# Altium footprint library CONN_HDR_1.27MM_ST.PcbLib: 116 footprints (part 8 of 9)
Each footprint in its own frame and in the unit in brackets; x right, y up, seen from the top. Pads: shape width x height; smd on the part's side, far side on the other; paste and mask are expansions set on the pad; w line width, h text height; cw(c..) or ccw(c..) is an arc to the next point about the centre after c.
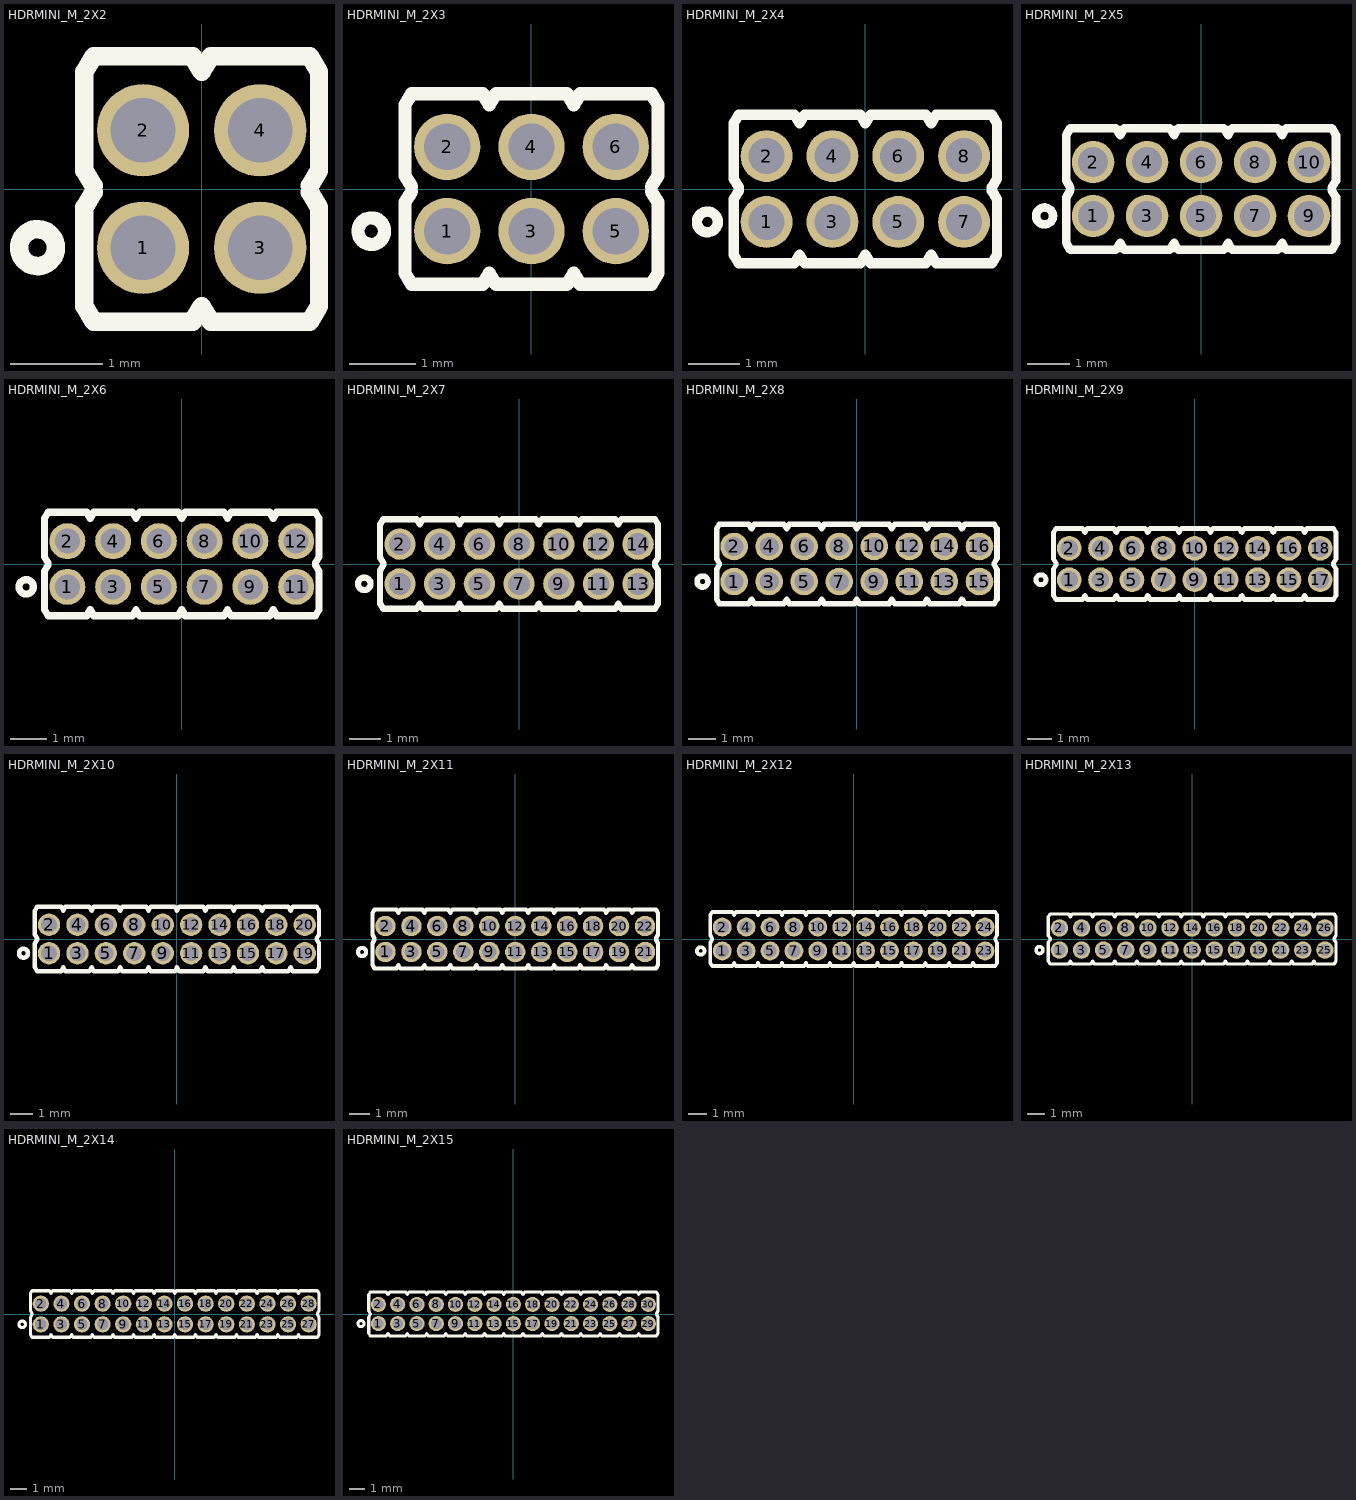
[diagram p7: the footprints below, top view; thin cyan lines are the x and y axes]

## HDRMINI_M_2X2 [mm] "mini header (50mil pitch)"
pads (4):
  round 1 hole 0.7 mask+0.05: 1(-0.635,-0.635) 2(-0.635,0.635) 3(0.635,-0.635) 4(0.635,0.635)
Top Overlay:
  circle w0.2: c-1.778,-0.635 r0.2
  lines w0.2: -1.171,-0.035 -1.27,-0.2 -1.27,-1.27 -1.171,-1.435 -0.099,-1.435 0,-1.27 0.099,-1.435 1.171,-1.435 1.27,-1.27 1.27,-0.2 1.171,-0.035 ; -1.171,0.035 -1.27,0.2 -1.27,1.27 -1.171,1.435 -0.099,1.435 0,1.27 0.099,1.435 1.171,1.435 1.27,1.27 1.27,0.2 1.171,0.035
3D body: height 2.8, standoff 0, extent 0,-1.27 1.27,0
3D body: height 7.3, standoff -2.5, extent 0.435,-0.835 0.835,-0.435
3D body: height 2.8, standoff 0, extent -1.27,-1.27 0,0
3D body: height 7.3, standoff -2.5, extent -0.835,-0.835 -0.435,-0.435
3D body: height 2.8, standoff 0, extent 0,0 1.27,1.27
3D body: height 7.3, standoff -2.5, extent 0.435,0.435 0.835,0.835
3D body: height 2.8, standoff 0, extent -1.27,0 0,1.27
3D body: height 7.3, standoff -2.5, extent -0.835,0.435 -0.435,0.835

## HDRMINI_M_2X3 [mm] "mini header (50mil pitch)"
pads (6):
  round 1 hole 0.7 mask+0.05: 1(-1.27,-0.635) 2(-1.27,0.635) 3(0,-0.635) 4(0,0.635) 5(1.27,-0.635) 6(1.27,0.635)
Top Overlay:
  circle w0.2: c-2.413,-0.635 r0.2
  lines w0.2: -1.806,-0.035 -1.905,-0.2 -1.905,-1.27 -1.806,-1.435 -0.734,-1.435 -0.635,-1.27 -0.536,-1.435 0.536,-1.435 0.635,-1.27 0.734,-1.435 1.806,-1.435 1.905,-1.27 1.905,-0.2 1.806,-0.035 ; -1.806,0.035 -1.905,0.2 -1.905,1.27 -1.806,1.435 -0.734,1.435 -0.635,1.27 -0.536,1.435 0.536,1.435 0.635,1.27 0.734,1.435 1.806,1.435 1.905,1.27 1.905,0.2 1.806,0.035
3D body: height 2.8, standoff 0, extent 0.635,-1.27 1.905,0
3D body: height 7.3, standoff -2.5, extent 1.07,-0.835 1.47,-0.435
3D body: height 2.8, standoff 0, extent 0.635,0 1.905,1.27
3D body: height 7.3, standoff -2.5, extent 1.07,0.435 1.47,0.835
3D body: height 2.8, standoff 0, extent -0.635,-1.27 0.635,0
3D body: height 7.3, standoff -2.5, extent -0.2,-0.835 0.2,-0.435
3D body: height 2.8, standoff 0, extent -1.905,-1.27 -0.635,0
3D body: height 7.3, standoff -2.5, extent -1.47,-0.835 -1.07,-0.435
3D body: height 2.8, standoff 0, extent -0.635,0 0.635,1.27
3D body: height 7.3, standoff -2.5, extent -0.2,0.435 0.2,0.835
3D body: height 2.8, standoff 0, extent -1.905,0 -0.635,1.27
3D body: height 7.3, standoff -2.5, extent -1.47,0.435 -1.07,0.835

## HDRMINI_M_2X4 [mm] "mini header (50mil pitch)"
pads (8):
  round 1 hole 0.7 mask+0.05: 1(-1.905,-0.635) 2(-1.905,0.635) 3(-0.635,-0.635) 4(-0.635,0.635) 5(0.635,-0.635) 6(0.635,0.635) 7(1.905,-0.635) 8(1.905,0.635)
Top Overlay:
  circle w0.2: c-3.048,-0.635 r0.2
  lines w0.2: -2.441,-0.035 -2.54,-0.2 -2.54,-1.27 -2.441,-1.435 -1.369,-1.435 -1.27,-1.27 -1.171,-1.435 -0.099,-1.435 0,-1.27 0.099,-1.435 1.171,-1.435 1.27,-1.27 1.369,-1.435 2.441,-1.435 2.54,-1.27 2.54,-0.2 2.441,-0.035 ; -2.441,0.035 -2.54,0.2 -2.54,1.27 -2.441,1.435 -1.369,1.435 -1.27,1.27 -1.171,1.435 -0.099,1.435 0,1.27 0.099,1.435 1.171,1.435 1.27,1.27 1.369,1.435 2.441,1.435 2.54,1.27 2.54,0.2 2.441,0.035
3D body: height 7.3, standoff -2.5, extent -2.105,0.435 -1.705,0.835
3D body: height 2.8, standoff 0, extent -2.54,0 -1.27,1.27
3D body: height 7.3, standoff -2.5, extent -0.835,0.435 -0.435,0.835
3D body: height 2.8, standoff 0, extent -1.27,0 0,1.27
3D body: height 7.3, standoff -2.5, extent -2.105,-0.835 -1.705,-0.435
3D body: height 2.8, standoff 0, extent -2.54,-1.27 -1.27,0
3D body: height 7.3, standoff -2.5, extent -0.835,-0.835 -0.435,-0.435
3D body: height 2.8, standoff 0, extent -1.27,-1.27 0,0
3D body: height 7.3, standoff -2.5, extent 0.435,0.435 0.835,0.835
3D body: height 2.8, standoff 0, extent 0,0 1.27,1.27
3D body: height 7.3, standoff -2.5, extent 1.705,0.435 2.105,0.835
3D body: height 2.8, standoff 0, extent 1.27,0 2.54,1.27
3D body: height 7.3, standoff -2.5, extent 0.435,-0.835 0.835,-0.435
3D body: height 2.8, standoff 0, extent 0,-1.27 1.27,0
3D body: height 7.3, standoff -2.5, extent 1.705,-0.835 2.105,-0.435
3D body: height 2.8, standoff 0, extent 1.27,-1.27 2.54,0

## HDRMINI_M_2X5 [mm] "mini header (50mil pitch)"
pads (10):
  round 1 hole 0.7 mask+0.05: 1(-2.54,-0.635) 2(-2.54,0.635) 3(-1.27,-0.635) 4(-1.27,0.635) 5(0,-0.635) 6(0,0.635) 7(1.27,-0.635) 8(1.27,0.635) 9(2.54,-0.635) 10(2.54,0.635)
Top Overlay:
  circle w0.2: c-3.683,-0.635 r0.2
  lines w0.2: -3.076,-0.035 -3.175,-0.2 -3.175,-1.27 -3.076,-1.435 -2.004,-1.435 -1.905,-1.27 -1.806,-1.435 -0.734,-1.435 -0.635,-1.27 -0.536,-1.435 0.536,-1.435 0.635,-1.27 0.734,-1.435 1.806,-1.435 1.905,-1.27 2.004,-1.435 3.076,-1.435 3.175,-1.27 3.175,-0.2 3.076,-0.035 ; -3.076,0.035 -3.175,0.2 -3.175,1.27 -3.076,1.435 -2.004,1.435 -1.905,1.27 -1.806,1.435 -0.734,1.435 -0.635,1.27 -0.536,1.435 0.536,1.435 0.635,1.27 0.734,1.435 1.806,1.435 1.905,1.27 2.004,1.435 3.076,1.435 3.175,1.27 3.175,0.2 3.076,0.035
3D body: height 7.3, standoff -2.5, extent -2.74,0.435 -2.34,0.835
3D body: height 2.8, standoff 0, extent -3.175,0 -1.905,1.27
3D body: height 7.3, standoff -2.5, extent -1.47,0.435 -1.07,0.835
3D body: height 2.8, standoff 0, extent -1.905,0 -0.635,1.27
3D body: height 7.3, standoff -2.5, extent -2.74,-0.835 -2.34,-0.435
3D body: height 2.8, standoff 0, extent -3.175,-1.27 -1.905,0
3D body: height 7.3, standoff -2.5, extent -1.47,-0.835 -1.07,-0.435
3D body: height 2.8, standoff 0, extent -1.905,-1.27 -0.635,0
3D body: height 7.3, standoff -2.5, extent -0.2,0.435 0.2,0.835
3D body: height 2.8, standoff 0, extent -0.635,0 0.635,1.27
3D body: height 7.3, standoff -2.5, extent 1.07,0.435 1.47,0.835
3D body: height 2.8, standoff 0, extent 0.635,0 1.905,1.27
3D body: height 7.3, standoff -2.5, extent -0.2,-0.835 0.2,-0.435
3D body: height 2.8, standoff 0, extent -0.635,-1.27 0.635,0
3D body: height 7.3, standoff -2.5, extent 1.07,-0.835 1.47,-0.435
3D body: height 2.8, standoff 0, extent 0.635,-1.27 1.905,0
3D body: height 7.3, standoff -2.5, extent 2.34,0.435 2.74,0.835
3D body: height 2.8, standoff 0, extent 1.905,0 3.175,1.27
3D body: height 7.3, standoff -2.5, extent 2.34,-0.835 2.74,-0.435
3D body: height 2.8, standoff 0, extent 1.905,-1.27 3.175,0

## HDRMINI_M_2X6 [mm] "mini header (50mil pitch)"
pads (12):
  round 1 hole 0.7 mask+0.05: 1(-3.175,-0.635) 2(-3.175,0.635) 3(-1.905,-0.635) 4(-1.905,0.635) 5(-0.635,-0.635) 6(-0.635,0.635) 7(0.635,-0.635) 8(0.635,0.635) 9(1.905,-0.635) 10(1.905,0.635) 11(3.175,-0.635) 12(3.175,0.635)
Top Overlay:
  circle w0.2: c-4.318,-0.635 r0.2
  lines w0.2: -3.711,-0.035 -3.81,-0.2 -3.81,-1.27 -3.711,-1.435 -2.639,-1.435 -2.54,-1.27 -2.441,-1.435 -1.369,-1.435 -1.27,-1.27 -1.171,-1.435 -0.099,-1.435 0,-1.27 0.099,-1.435 1.171,-1.435 1.27,-1.27 1.369,-1.435 2.441,-1.435 2.54,-1.27 2.639,-1.435 3.711,-1.435 3.81,-1.27 3.81,-0.2 3.711,-0.035 ; -3.711,0.035 -3.81,0.2 -3.81,1.27 -3.711,1.435 -2.639,1.435 -2.54,1.27 -2.441,1.435 -1.369,1.435 -1.27,1.27 -1.171,1.435 -0.099,1.435 0,1.27 0.099,1.435 1.171,1.435 1.27,1.27 1.369,1.435 2.441,1.435 2.54,1.27 2.639,1.435 3.711,1.435 3.81,1.27 3.81,0.2 3.711,0.035
3D body: height 7.3, standoff -2.5, extent -3.375,0.435 -2.975,0.835
3D body: height 2.8, standoff 0, extent -3.81,0 -2.54,1.27
3D body: height 7.3, standoff -2.5, extent -2.105,0.435 -1.705,0.835
3D body: height 2.8, standoff 0, extent -2.54,0 -1.27,1.27
3D body: height 7.3, standoff -2.5, extent -3.375,-0.835 -2.975,-0.435
3D body: height 2.8, standoff 0, extent -3.81,-1.27 -2.54,0
3D body: height 7.3, standoff -2.5, extent -2.105,-0.835 -1.705,-0.435
3D body: height 2.8, standoff 0, extent -2.54,-1.27 -1.27,0
3D body: height 7.3, standoff -2.5, extent -0.835,0.435 -0.435,0.835
3D body: height 2.8, standoff 0, extent -1.27,0 0,1.27
3D body: height 7.3, standoff -2.5, extent 0.435,0.435 0.835,0.835
3D body: height 2.8, standoff 0, extent 0,0 1.27,1.27
3D body: height 7.3, standoff -2.5, extent -0.835,-0.835 -0.435,-0.435
3D body: height 2.8, standoff 0, extent -1.27,-1.27 0,0
3D body: height 7.3, standoff -2.5, extent 0.435,-0.835 0.835,-0.435
3D body: height 2.8, standoff 0, extent 0,-1.27 1.27,0
3D body: height 7.3, standoff -2.5, extent 1.705,0.435 2.105,0.835
3D body: height 2.8, standoff 0, extent 1.27,0 2.54,1.27
3D body: height 7.3, standoff -2.5, extent 2.975,0.435 3.375,0.835
3D body: height 2.8, standoff 0, extent 2.54,0 3.81,1.27
3D body: height 7.3, standoff -2.5, extent 1.705,-0.835 2.105,-0.435
3D body: height 2.8, standoff 0, extent 1.27,-1.27 2.54,0
3D body: height 7.3, standoff -2.5, extent 2.975,-0.835 3.375,-0.435
3D body: height 2.8, standoff 0, extent 2.54,-1.27 3.81,0

## HDRMINI_M_2X7 [mm] "mini header (50mil pitch)"
pads (14):
  round 1 hole 0.7 mask+0.05: 1(-3.81,-0.635) 2(-3.81,0.635) 3(-2.54,-0.635) 4(-2.54,0.635) 5(-1.27,-0.635) 6(-1.27,0.635) 7(0,-0.635) 8(0,0.635) 9(1.27,-0.635) 10(1.27,0.635) 11(2.54,-0.635) 12(2.54,0.635) 13(3.81,-0.635) 14(3.81,0.635)
Top Overlay:
  circle w0.2: c-4.953,-0.635 r0.2
  lines w0.2: -4.346,-0.035 -4.445,-0.2 -4.445,-1.27 -4.346,-1.435 -3.274,-1.435 -3.175,-1.27 -3.076,-1.435 -2.004,-1.435 -1.905,-1.27 -1.806,-1.435 -0.734,-1.435 -0.635,-1.27 -0.536,-1.435 0.536,-1.435 0.635,-1.27 0.734,-1.435 1.806,-1.435 1.905,-1.27 2.004,-1.435 3.076,-1.435 3.175,-1.27 3.274,-1.435 4.346,-1.435 4.445,-1.27 4.445,-0.2 4.346,-0.035 ; -4.346,0.035 -4.445,0.2 -4.445,1.27 -4.346,1.435 -3.274,1.435 -3.175,1.27 -3.076,1.435 -2.004,1.435 -1.905,1.27 -1.806,1.435 -0.734,1.435 -0.635,1.27 -0.536,1.435 0.536,1.435 0.635,1.27 0.734,1.435 1.806,1.435 1.905,1.27 2.004,1.435 3.076,1.435 3.175,1.27 3.274,1.435 4.346,1.435 4.445,1.27 4.445,0.2 4.346,0.035
3D body: height 7.3, standoff -2.5, extent -4.01,0.435 -3.61,0.835
3D body: height 2.8, standoff 0, extent -4.445,0 -3.175,1.27
3D body: height 7.3, standoff -2.5, extent -2.74,0.435 -2.34,0.835
3D body: height 2.8, standoff 0, extent -3.175,0 -1.905,1.27
3D body: height 7.3, standoff -2.5, extent -4.01,-0.835 -3.61,-0.435
3D body: height 2.8, standoff 0, extent -4.445,-1.27 -3.175,0
3D body: height 7.3, standoff -2.5, extent -2.74,-0.835 -2.34,-0.435
3D body: height 2.8, standoff 0, extent -3.175,-1.27 -1.905,0
3D body: height 7.3, standoff -2.5, extent -1.47,0.435 -1.07,0.835
3D body: height 2.8, standoff 0, extent -1.905,0 -0.635,1.27
3D body: height 7.3, standoff -2.5, extent -0.2,0.435 0.2,0.835
3D body: height 2.8, standoff 0, extent -0.635,0 0.635,1.27
3D body: height 7.3, standoff -2.5, extent -1.47,-0.835 -1.07,-0.435
3D body: height 2.8, standoff 0, extent -1.905,-1.27 -0.635,0
3D body: height 7.3, standoff -2.5, extent -0.2,-0.835 0.2,-0.435
3D body: height 2.8, standoff 0, extent -0.635,-1.27 0.635,0
3D body: height 7.3, standoff -2.5, extent 1.07,0.435 1.47,0.835
3D body: height 2.8, standoff 0, extent 0.635,0 1.905,1.27
3D body: height 7.3, standoff -2.5, extent 2.34,0.435 2.74,0.835
3D body: height 2.8, standoff 0, extent 1.905,0 3.175,1.27
3D body: height 7.3, standoff -2.5, extent 1.07,-0.835 1.47,-0.435
3D body: height 2.8, standoff 0, extent 0.635,-1.27 1.905,0
3D body: height 7.3, standoff -2.5, extent 2.34,-0.835 2.74,-0.435
3D body: height 2.8, standoff 0, extent 1.905,-1.27 3.175,0
3D body: height 7.3, standoff -2.5, extent 3.61,0.435 4.01,0.835
3D body: height 2.8, standoff 0, extent 3.175,0 4.445,1.27
3D body: height 7.3, standoff -2.5, extent 3.61,-0.835 4.01,-0.435
3D body: height 2.8, standoff 0, extent 3.175,-1.27 4.445,0

## HDRMINI_M_2X8 [mm] "mini header (50mil pitch)"
pads (16):
  round 1 hole 0.7 mask+0.05: 1(-4.445,-0.635) 2(-4.445,0.635) 3(-3.175,-0.635) 4(-3.175,0.635) 5(-1.905,-0.635) 6(-1.905,0.635) 7(-0.635,-0.635) 8(-0.635,0.635) 9(0.635,-0.635) 10(0.635,0.635) 11(1.905,-0.635) 12(1.905,0.635) 13(3.175,-0.635) 14(3.175,0.635) 15(4.445,-0.635) 16(4.445,0.635)
Top Overlay:
  circle w0.2: c-5.588,-0.635 r0.2
  lines w0.2: -4.981,-0.035 -5.08,-0.2 -5.08,-1.27 -4.981,-1.435 -3.909,-1.435 -3.81,-1.27 -3.711,-1.435 -2.639,-1.435 -2.54,-1.27 -2.441,-1.435 -1.369,-1.435 -1.27,-1.27 -1.171,-1.435 -0.099,-1.435 0,-1.27 0.099,-1.435 1.171,-1.435 1.27,-1.27 1.369,-1.435 2.441,-1.435 2.54,-1.27 2.639,-1.435 3.711,-1.435 3.81,-1.27 3.909,-1.435 4.981,-1.435 5.08,-1.27 5.08,-0.2 4.981,-0.035 ; -4.981,0.035 -5.08,0.2 -5.08,1.27 -4.981,1.435 -3.909,1.435 -3.81,1.27 -3.711,1.435 -2.639,1.435 -2.54,1.27 -2.441,1.435 -1.369,1.435 -1.27,1.27 -1.171,1.435 -0.099,1.435 0,1.27 0.099,1.435 1.171,1.435 1.27,1.27 1.369,1.435 2.441,1.435 2.54,1.27 2.639,1.435 3.711,1.435 3.81,1.27 3.909,1.435 4.981,1.435 5.08,1.27 5.08,0.2 4.981,0.035
3D body: height 7.3, standoff -2.5, extent -4.645,0.435 -4.245,0.835
3D body: height 2.8, standoff 0, extent -5.08,0 -3.81,1.27
3D body: height 7.3, standoff -2.5, extent -3.375,0.435 -2.975,0.835
3D body: height 2.8, standoff 0, extent -3.81,0 -2.54,1.27
3D body: height 7.3, standoff -2.5, extent -4.645,-0.835 -4.245,-0.435
3D body: height 2.8, standoff 0, extent -5.08,-1.27 -3.81,0
3D body: height 7.3, standoff -2.5, extent -3.375,-0.835 -2.975,-0.435
3D body: height 2.8, standoff 0, extent -3.81,-1.27 -2.54,0
3D body: height 7.3, standoff -2.5, extent -2.105,0.435 -1.705,0.835
3D body: height 2.8, standoff 0, extent -2.54,0 -1.27,1.27
3D body: height 7.3, standoff -2.5, extent -0.835,0.435 -0.435,0.835
3D body: height 2.8, standoff 0, extent -1.27,0 0,1.27
3D body: height 7.3, standoff -2.5, extent -2.105,-0.835 -1.705,-0.435
3D body: height 2.8, standoff 0, extent -2.54,-1.27 -1.27,0
3D body: height 7.3, standoff -2.5, extent -0.835,-0.835 -0.435,-0.435
3D body: height 2.8, standoff 0, extent -1.27,-1.27 0,0
3D body: height 7.3, standoff -2.5, extent 0.435,0.435 0.835,0.835
3D body: height 2.8, standoff 0, extent 0,0 1.27,1.27
3D body: height 7.3, standoff -2.5, extent 1.705,0.435 2.105,0.835
3D body: height 2.8, standoff 0, extent 1.27,0 2.54,1.27
3D body: height 7.3, standoff -2.5, extent 0.435,-0.835 0.835,-0.435
3D body: height 2.8, standoff 0, extent 0,-1.27 1.27,0
3D body: height 7.3, standoff -2.5, extent 1.705,-0.835 2.105,-0.435
3D body: height 2.8, standoff 0, extent 1.27,-1.27 2.54,0
3D body: height 7.3, standoff -2.5, extent 2.975,0.435 3.375,0.835
3D body: height 2.8, standoff 0, extent 2.54,0 3.81,1.27
3D body: height 7.3, standoff -2.5, extent 4.245,0.435 4.645,0.835
3D body: height 2.8, standoff 0, extent 3.81,0 5.08,1.27
3D body: height 7.3, standoff -2.5, extent 2.975,-0.835 3.375,-0.435
3D body: height 2.8, standoff 0, extent 2.54,-1.27 3.81,0
3D body: height 7.3, standoff -2.5, extent 4.245,-0.835 4.645,-0.435
3D body: height 2.8, standoff 0, extent 3.81,-1.27 5.08,0

## HDRMINI_M_2X9 [mm] "mini header (50mil pitch)"
pads (18):
  round 1 hole 0.7 mask+0.05: 1(-5.08,-0.635) 2(-5.08,0.635) 3(-3.81,-0.635) 4(-3.81,0.635) 5(-2.54,-0.635) 6(-2.54,0.635) 7(-1.27,-0.635) 8(-1.27,0.635) 9(0,-0.635) 10(0,0.635) 11(1.27,-0.635) 12(1.27,0.635) 13(2.54,-0.635) 14(2.54,0.635) 15(3.81,-0.635) 16(3.81,0.635) 17(5.08,-0.635) 18(5.08,0.635)
Top Overlay:
  circle w0.2: c-6.223,-0.635 r0.2
  lines w0.2: -5.616,-0.035 -5.715,-0.2 -5.715,-1.27 -5.616,-1.435 -4.544,-1.435 -4.445,-1.27 -4.346,-1.435 -3.274,-1.435 -3.175,-1.27 -3.076,-1.435 -2.004,-1.435 -1.905,-1.27 -1.806,-1.435 -0.734,-1.435 -0.635,-1.27 -0.536,-1.435 0.536,-1.435 0.635,-1.27 0.734,-1.435 1.806,-1.435 1.905,-1.27 2.004,-1.435 3.076,-1.435 3.175,-1.27 3.274,-1.435 4.346,-1.435 4.445,-1.27 4.544,-1.435 5.616,-1.435 5.715,-1.27 5.715,-0.2 5.616,-0.035 ; -5.616,0.035 -5.715,0.2 -5.715,1.27 -5.616,1.435 -4.544,1.435 -4.445,1.27 -4.346,1.435 -3.274,1.435 -3.175,1.27 -3.076,1.435 -2.004,1.435 -1.905,1.27 -1.806,1.435 -0.734,1.435 -0.635,1.27 -0.536,1.435 0.536,1.435 0.635,1.27 0.734,1.435 1.806,1.435 1.905,1.27 2.004,1.435 3.076,1.435 3.175,1.27 3.274,1.435 4.346,1.435 4.445,1.27 4.544,1.435 5.616,1.435 5.715,1.27 5.715,0.2 5.616,0.035
3D body: height 7.3, standoff -2.5, extent -5.28,0.435 -4.88,0.835
3D body: height 2.8, standoff 0, extent -5.715,0 -4.445,1.27
3D body: height 7.3, standoff -2.5, extent -4.01,0.435 -3.61,0.835
3D body: height 2.8, standoff 0, extent -4.445,0 -3.175,1.27
3D body: height 7.3, standoff -2.5, extent -5.28,-0.835 -4.88,-0.435
3D body: height 2.8, standoff 0, extent -5.715,-1.27 -4.445,0
3D body: height 7.3, standoff -2.5, extent -4.01,-0.835 -3.61,-0.435
3D body: height 2.8, standoff 0, extent -4.445,-1.27 -3.175,0
3D body: height 7.3, standoff -2.5, extent -2.74,0.435 -2.34,0.835
3D body: height 2.8, standoff 0, extent -3.175,0 -1.905,1.27
3D body: height 7.3, standoff -2.5, extent -1.47,0.435 -1.07,0.835
3D body: height 2.8, standoff 0, extent -1.905,0 -0.635,1.27
3D body: height 7.3, standoff -2.5, extent -2.74,-0.835 -2.34,-0.435
3D body: height 2.8, standoff 0, extent -3.175,-1.27 -1.905,0
3D body: height 7.3, standoff -2.5, extent -1.47,-0.835 -1.07,-0.435
3D body: height 2.8, standoff 0, extent -1.905,-1.27 -0.635,0
3D body: height 7.3, standoff -2.5, extent -0.2,0.435 0.2,0.835
3D body: height 2.8, standoff 0, extent -0.635,0 0.635,1.27
3D body: height 7.3, standoff -2.5, extent 1.07,0.435 1.47,0.835
3D body: height 2.8, standoff 0, extent 0.635,0 1.905,1.27
3D body: height 7.3, standoff -2.5, extent -0.2,-0.835 0.2,-0.435
3D body: height 2.8, standoff 0, extent -0.635,-1.27 0.635,0
3D body: height 7.3, standoff -2.5, extent 1.07,-0.835 1.47,-0.435
3D body: height 2.8, standoff 0, extent 0.635,-1.27 1.905,0
3D body: height 7.3, standoff -2.5, extent 2.34,0.435 2.74,0.835
3D body: height 2.8, standoff 0, extent 1.905,0 3.175,1.27
3D body: height 7.3, standoff -2.5, extent 3.61,0.435 4.01,0.835
3D body: height 2.8, standoff 0, extent 3.175,0 4.445,1.27
3D body: height 7.3, standoff -2.5, extent 2.34,-0.835 2.74,-0.435
3D body: height 2.8, standoff 0, extent 1.905,-1.27 3.175,0
3D body: height 7.3, standoff -2.5, extent 3.61,-0.835 4.01,-0.435
3D body: height 2.8, standoff 0, extent 3.175,-1.27 4.445,0
3D body: height 7.3, standoff -2.5, extent 4.88,0.435 5.28,0.835
3D body: height 2.8, standoff 0, extent 4.445,0 5.715,1.27
3D body: height 7.3, standoff -2.5, extent 4.88,-0.835 5.28,-0.435
3D body: height 2.8, standoff 0, extent 4.445,-1.27 5.715,0

## HDRMINI_M_2X10 [mm] "mini header (50mil pitch)"
pads (20):
  round 1 hole 0.7 mask+0.05: 1(-5.715,-0.635) 2(-5.715,0.635) 3(-4.445,-0.635) 4(-4.445,0.635) 5(-3.175,-0.635) 6(-3.175,0.635) 7(-1.905,-0.635) 8(-1.905,0.635) 9(-0.635,-0.635) 10(-0.635,0.635) 11(0.635,-0.635) 12(0.635,0.635) 13(1.905,-0.635) 14(1.905,0.635) 15(3.175,-0.635) 16(3.175,0.635) 17(4.445,-0.635) 18(4.445,0.635) 19(5.715,-0.635) 20(5.715,0.635)
Top Overlay:
  circle w0.2: c-6.858,-0.635 r0.2
  lines w0.2: -6.251,-0.035 -6.35,-0.2 -6.35,-1.27 -6.251,-1.435 -5.179,-1.435 -5.08,-1.27 -4.981,-1.435 -3.909,-1.435 -3.81,-1.27 -3.711,-1.435 -2.639,-1.435 -2.54,-1.27 -2.441,-1.435 -1.369,-1.435 -1.27,-1.27 -1.171,-1.435 -0.099,-1.435 0,-1.27 0.099,-1.435 1.171,-1.435 1.27,-1.27 1.369,-1.435 2.441,-1.435 2.54,-1.27 2.639,-1.435 3.711,-1.435 3.81,-1.27 3.909,-1.435 4.981,-1.435 5.08,-1.27 5.179,-1.435 6.251,-1.435 6.35,-1.27 6.35,-0.2 6.251,-0.035 ; -6.251,0.035 -6.35,0.2 -6.35,1.27 -6.251,1.435 -5.179,1.435 -5.08,1.27 -4.981,1.435 -3.909,1.435 -3.81,1.27 -3.711,1.435 -2.639,1.435 -2.54,1.27 -2.441,1.435 -1.369,1.435 -1.27,1.27 -1.171,1.435 -0.099,1.435 0,1.27 0.099,1.435 1.171,1.435 1.27,1.27 1.369,1.435 2.441,1.435 2.54,1.27 2.639,1.435 3.711,1.435 3.81,1.27 3.909,1.435 4.981,1.435 5.08,1.27 5.179,1.435 6.251,1.435 6.35,1.27 6.35,0.2 6.251,0.035
3D body: height 2.8, standoff 0, extent 5.08,-1.27 6.35,0
3D body: height 7.3, standoff -2.5, extent 5.515,-0.835 5.915,-0.435
3D body: height 2.8, standoff 0, extent 3.81,-1.27 5.08,0
3D body: height 7.3, standoff -2.5, extent 4.245,-0.835 4.645,-0.435
3D body: height 2.8, standoff 0, extent 5.08,0 6.35,1.27
3D body: height 7.3, standoff -2.5, extent 5.515,0.435 5.915,0.835
3D body: height 2.8, standoff 0, extent 3.81,0 5.08,1.27
3D body: height 7.3, standoff -2.5, extent 4.245,0.435 4.645,0.835
3D body: height 2.8, standoff 0, extent 2.54,-1.27 3.81,0
3D body: height 7.3, standoff -2.5, extent 2.975,-0.835 3.375,-0.435
3D body: height 2.8, standoff 0, extent 1.27,-1.27 2.54,0
3D body: height 7.3, standoff -2.5, extent 1.705,-0.835 2.105,-0.435
3D body: height 2.8, standoff 0, extent 2.54,0 3.81,1.27
3D body: height 7.3, standoff -2.5, extent 2.975,0.435 3.375,0.835
3D body: height 2.8, standoff 0, extent 1.27,0 2.54,1.27
3D body: height 7.3, standoff -2.5, extent 1.705,0.435 2.105,0.835
3D body: height 2.8, standoff 0, extent 0,-1.27 1.27,0
3D body: height 7.3, standoff -2.5, extent 0.435,-0.835 0.835,-0.435
3D body: height 2.8, standoff 0, extent -1.27,-1.27 0,0
3D body: height 7.3, standoff -2.5, extent -0.835,-0.835 -0.435,-0.435
3D body: height 2.8, standoff 0, extent 0,0 1.27,1.27
3D body: height 7.3, standoff -2.5, extent 0.435,0.435 0.835,0.835
3D body: height 2.8, standoff 0, extent -1.27,0 0,1.27
3D body: height 7.3, standoff -2.5, extent -0.835,0.435 -0.435,0.835
3D body: height 2.8, standoff 0, extent -2.54,-1.27 -1.27,0
3D body: height 7.3, standoff -2.5, extent -2.105,-0.835 -1.705,-0.435
3D body: height 2.8, standoff 0, extent -3.81,-1.27 -2.54,0